# Altium footprint library CADTcommon.PcbLib: 503 footprints (part 27 of 32)
Each footprint in its own frame and in the unit in brackets; x right, y up, seen from the top. Pads: shape width x height; smd on the part's side, far side on the other; paste and mask are expansions set on the pad; w line width, h text height; cw(c..) or ccw(c..) is an arc to the next point about the centre after c.
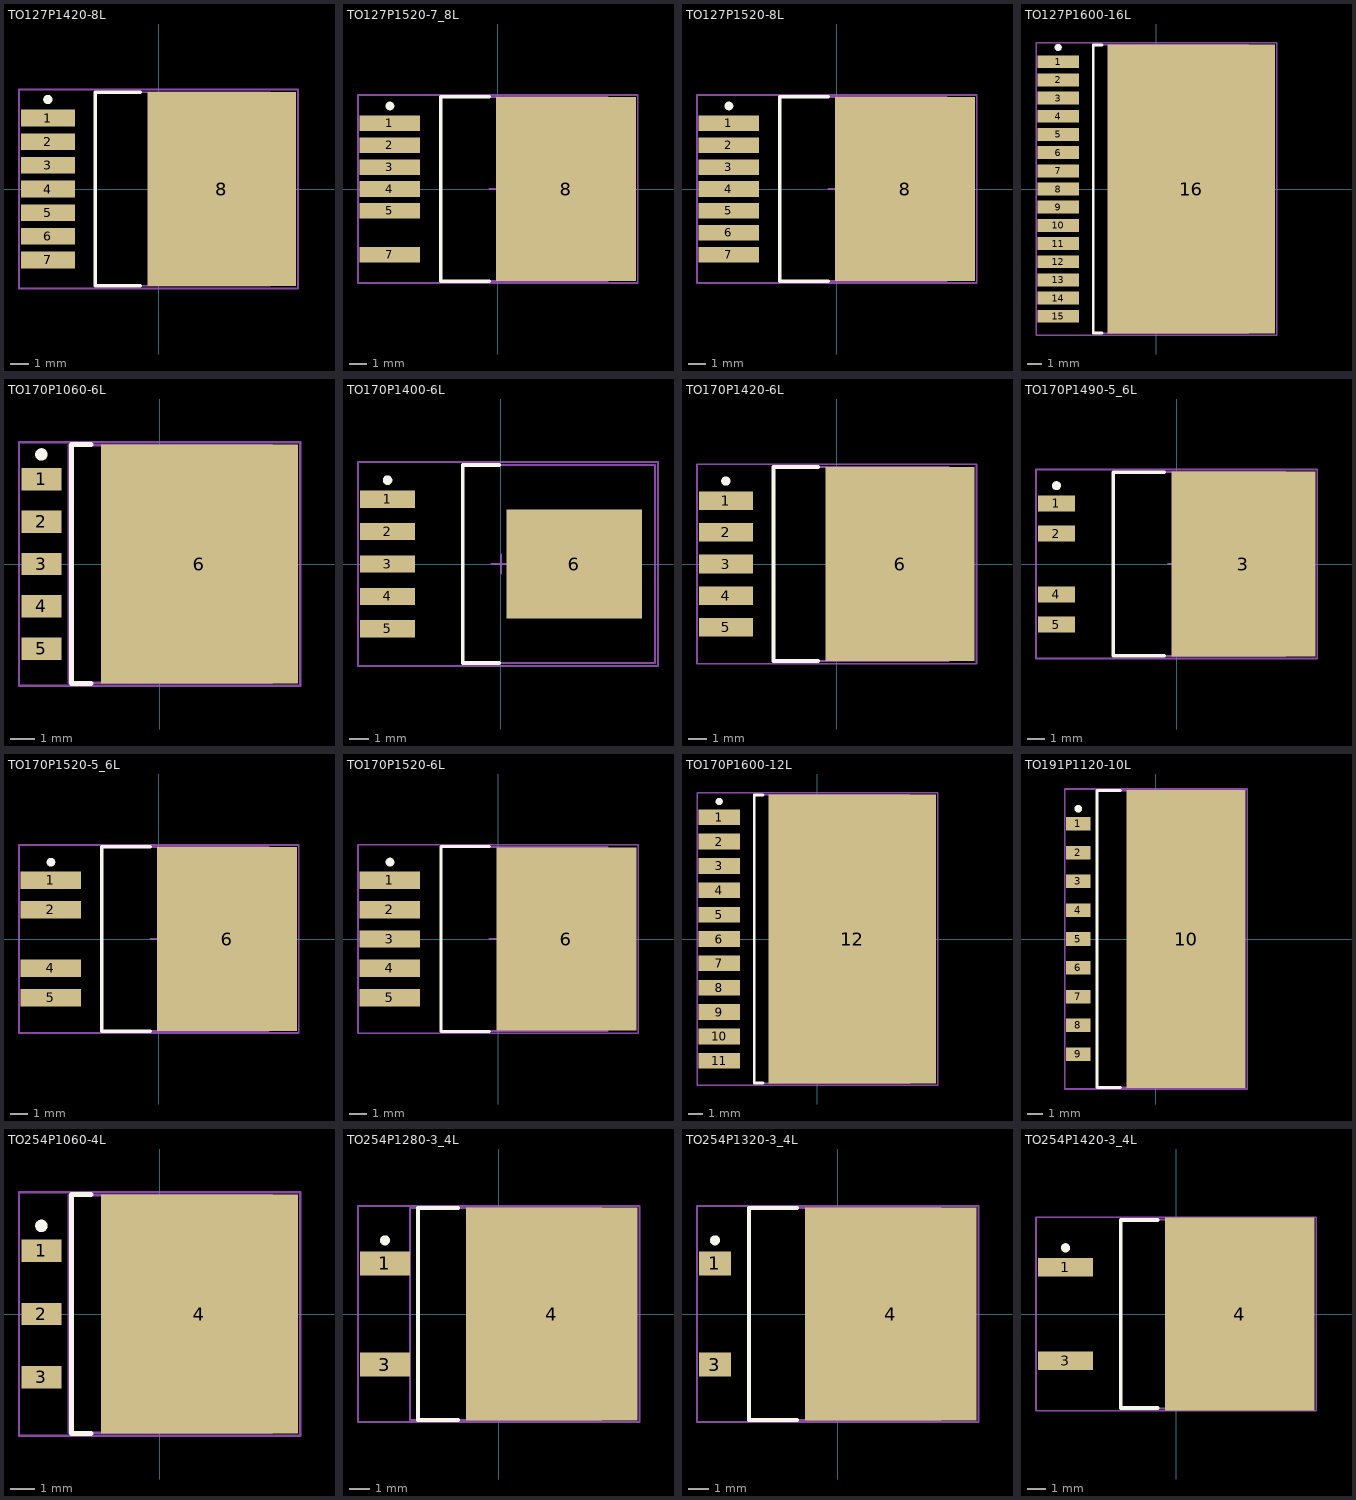
[diagram p26: the footprints below, top view; thin cyan lines are the x and y axes]

## TO127P1420-8L [mm] "D2-PAK, 8-Leads, Body 8.9x10.1mm, Pitch 1.27mm, Lead Span 14.2mm, IPC High Density"
height 4.65
pads (8):
  rect 2.9x0.9 smd: 1(-5.95,3.81) 2(-5.95,2.54) 3(-5.95,1.27) 4(-5.95,0) 5(-5.95,-1.27) 6(-5.95,-2.54) 7(-5.95,-3.81)
  rect 8x10.45 smd: 8(3.4,0)
Top Overlay:
  circle w0.25: c-5.95,4.81 r0.125
  lines w0.2: -1,-5.2 -3.4,-5.2 -3.4,5.2 -1,5.2
Mechanical 13:
  lines w0.1: -3.4,-5.2 6,-5.2 6,5.2 -3.4,5.2 -3.4,-5.2
Mechanical 15:
  lines w0.1: -0.5,0 0.5,0 ; 0,-0.5 0,0.5 ; -7.5,-5.35 7.5,-5.35 7.5,5.35 -7.5,5.35 -7.5,-5.35
3D body: height 4.65, standoff 0, extent -3.4,-5.2 6,5.2

## TO127P1520-7_8L [mm] "D2-PAK, 8-Leads, Body 9x10.2mm, Pitch 1.27mm, Lead Span 15.2mm, IPC High Density"
height 4.83
pads (7):
  rect 3.5x0.9 smd: 1(-6.25,3.81) 2(-6.25,2.54) 3(-6.25,1.27) 4(-6.25,0) 5(-6.25,-1.27) 7(-6.25,-3.81)
  rect 8.1x10.65 smd: 8(3.95,0)
Top Overlay:
  circle w0.25: c-6.25,4.81 r0.125
  lines w0.2: -0.5,-5.35 -3.3,-5.35 -3.3,5.35 -0.5,5.35
Mechanical 13:
  lines w0.1: -3.3,-5.325 -3.3,5.325 6.35,5.325 6.35,-5.325 -3.3,-5.325
Mechanical 15:
  lines w0.1: -0.5,0 0.5,0 ; 0,-0.5 0,0.5 ; -8.1,-5.45 -8.1,5.45 8.1,5.45 8.1,-5.45 -8.1,-5.45
3D body: height 4.83, standoff 0, extent -3.3,-5.325 6.35,5.325

## TO127P1520-8L [mm] "D2-PAK, 8-Leads, Body 9x10.2mm, Pitch 1.27mm, Lead Span 15.2mm, IPC High Density"
height 4.83
pads (8):
  rect 3.5x0.9 smd: 1(-6.25,3.81) 2(-6.25,2.54) 3(-6.25,1.27) 4(-6.25,0) 5(-6.25,-1.27) 6(-6.25,-2.54) 7(-6.25,-3.81)
  rect 8.1x10.65 smd: 8(3.95,0)
Top Overlay:
  circle w0.25: c-6.25,4.81 r0.125
  lines w0.2: -0.5,-5.35 -3.3,-5.35 -3.3,5.35 -0.5,5.35
Mechanical 13:
  lines w0.1: -3.3,-5.325 6.35,-5.325 6.35,5.325 -3.3,5.325 -3.3,-5.325
Mechanical 15:
  lines w0.1: -0.5,0 0.5,0 ; 0,-0.5 0,0.5 ; -8.1,-5.45 8.1,-5.45 8.1,5.45 -8.1,5.45 -8.1,-5.45
3D body: height 4.83, standoff 0, extent -3.3,-5.325 6.35,5.325

## TO127P1600-16L [mm] "TO, 16-Leads, Body 10.7x20mm, Pitch 1.27mm, Lead Span 16mm, IPC High Density"
height 4.65
pads (16):
  rect 2.9x0.9 smd: 1(-6.85,8.89) 2(-6.85,7.62) 3(-6.85,6.35) 4(-6.85,5.08) 5(-6.85,3.81) 6(-6.85,2.54) 7(-6.85,1.27) 8(-6.85,0) 9(-6.85,-1.27) 10(-6.85,-2.54) 11(-6.85,-3.81) 12(-6.85,-5.08) 13(-6.85,-6.35) 14(-6.85,-7.62) 15(-6.85,-8.89)
  rect 11.7x20.2 smd: 16(2.45,0)
Top Overlay:
  circle w0.25: c-6.85,9.89 r0.125
  lines w0.2: -3.8,-10.05 -4.4,-10.05 -4.4,10.05 -3.8,10.05
Mechanical 13:
  lines w0.1: -4.4,-10.075 6.42,-10.075 6.42,10.075 -4.4,10.075 -4.4,-10.075
Mechanical 15:
  lines w0.1: -0.5,0 0.5,0 ; 0,-0.5 0,0.5 ; -8.4,-10.2 8.4,-10.2 8.4,10.2 -8.4,10.2 -8.4,-10.2
3D body: height 4.65, standoff 0, extent -4.4,-10.075 6.42,10.075

## TO170P1060-6L [mm] "D-PAK, 6-Leads, Body 8x9.4mm, Pitch 1.7mm, Lead Span 10.6mm, IPC High Density"
height 2.05
pads (6):
  rect 1.6x0.9 smd: 1(-4.75,3.4) 2(-4.75,1.7) 3(-4.75,0) 4(-4.75,-1.7) 5(-4.75,-3.4)
  rect 7.9x9.6 smd: 6(1.6,0)
Top Overlay:
  circle w0.25: c-4.75,4.4 r0.125
  lines w0.2: -2.75,-4.8 -3.55,-4.8 -3.55,4.8 -2.75,4.8
Mechanical 13:
  lines w0.1: -3.65,-4.775 -3.65,4.775 4.5,4.775 4.5,-4.775 -3.65,-4.775
Mechanical 15:
  lines w0.1: -0.5,0 0.5,0 ; 0,-0.5 0,0.5 ; -5.65,-4.9 -5.65,4.9 5.65,4.9 5.65,-4.9 -5.65,-4.9
3D body: height 2.05, standoff 0, extent -3.65,-4.775 4.5,4.775

## TO170P1400-6L [mm] "D2-PAK, 6-Leads, Body 9.9x10.2mm, Pitch 1.7mm, Lead Span 14mm, IPC High Density"
height 2.1
pads (6):
  rect 2.9x0.9 smd: 1(-5.95,3.4) 2(-5.95,1.7) 3(-5.95,0) 4(-5.95,-1.7) 5(-5.95,-3.4)
  rect 7.1x5.7 smd: 6(3.85,0)
Top Overlay:
  circle w0.25: c-5.95,4.4 r0.125
  lines w0.2: -0.1,-5.2 -2,-5.2 -2,5.2 -0.1,5.2
Mechanical 13:
  lines w0.1: -2,-5.2 -2,5.2 8.1,5.2 8.1,-5.2 -2,-5.2
Mechanical 15:
  lines w0.1: -0.5,0 0.5,0 ; 0,-0.5 0,0.5 ; -7.5,-5.35 -7.5,5.35 8.25,5.35 8.25,-5.35 -7.5,-5.35
3D body: height 2.1, standoff 0, extent -1.999,-5.199 8.099,5.199

## TO170P1420-6L [mm] "D2-PAK, 6-Leads, Body 8.9x10.1mm, Pitch 1.7mm, Lead Span 14.2mm, IPC High Density"
height 4.65
pads (6):
  rect 2.9x1 smd: 1(-5.95,3.4) 2(-5.95,1.7) 3(-5.95,0) 4(-5.95,-1.7) 5(-5.95,-3.4)
  rect 8x10.4 smd: 6(3.4,0)
Top Overlay:
  circle w0.25: c-5.95,4.45 r0.125
  lines w0.2: -1,-5.2 -3.4,-5.2 -3.4,5.2 -1,5.2
Mechanical 13:
  lines w0.1: -3.4,-5.2 6,-5.2 6,5.2 -3.4,5.2 -3.4,-5.2
Mechanical 15:
  lines w0.1: -0.5,0 0.5,0 ; 0,-0.5 0,0.5 ; -7.5,-5.35 7.5,-5.35 7.5,5.35 -7.5,5.35 -7.5,-5.35
3D body: height 4.65, standoff 0, extent -3.4,-5.2 6,5.2

## TO170P1490-5_6L [mm] "D2-PAK, 6-Leads, Body 9.1x10.3mm, Pitch 1.7mm, Lead Span 14.9mm, IPC High Density"
height 4.55
pads (5):
  rect 2.1x0.9 smd: 1(-6.75,3.4) 2(-6.75,1.7) 4(-6.75,-1.7) 5(-6.75,-3.4)
  rect 8.1x10.4 smd: 3(3.75,0)
Top Overlay:
  circle w0.25: c-6.75,4.4 r0.125
  lines w0.2: -0.7,-5.15 -3.55,-5.15 -3.55,5.15 -0.7,5.15
Mechanical 13:
  lines w0.1: -3.55,-5.175 -3.55,5.175 6.1,5.175 6.1,-5.175 -3.55,-5.175
Mechanical 15:
  lines w0.1: -0.5,0 0.5,0 ; 0,-0.5 0,0.5 ; -7.9,-5.3 -7.9,5.3 7.9,5.3 7.9,-5.3 -7.9,-5.3
3D body: height 4.55, standoff 0, extent -3.55,-5.175 6.1,5.175

## TO170P1520-5_6L [mm] "D2-PAK, 6-Leads, Body 9x10.2mm, Pitch 1.7mm, Lead Span 15.2mm, IPC High Density"
height 4.83
pads (5):
  rect 3.5x1 smd: 1(-6.25,3.4) 2(-6.25,1.7) 4(-6.25,-1.7) 5(-6.25,-3.4)
  rect 8.1x10.65 smd: 6(3.95,0)
Top Overlay:
  circle w0.25: c-6.25,4.45 r0.125
  lines w0.2: -0.5,-5.35 -3.3,-5.35 -3.3,5.35 -0.5,5.35
Mechanical 13:
  lines w0.1: -3.3,-5.325 6.35,-5.325 6.35,5.325 -3.3,5.325 -3.3,-5.325
Mechanical 15:
  lines w0.1: -0.5,0 0.5,0 ; 0,-0.5 0,0.5 ; -8.1,-5.45 8.1,-5.45 8.1,5.45 -8.1,5.45 -8.1,-5.45
3D body: height 4.83, standoff 0, extent -3.3,-5.325 6.35,5.325

## TO170P1520-6L [mm] "D2-PAK, 6-Leads, Body 9x10.2mm, Pitch 1.7mm, Lead Span 15.2mm, IPC High Density"
height 4.83
pads (6):
  rect 3.5x1 smd: 1(-6.25,3.4) 2(-6.25,1.7) 3(-6.25,0) 4(-6.25,-1.7) 5(-6.25,-3.4)
  rect 8.1x10.6 smd: 6(3.95,0)
Top Overlay:
  circle w0.25: c-6.25,4.45 r0.125
  lines w0.2: -0.5,-5.35 -3.3,-5.35 -3.3,5.35 -0.5,5.35
Mechanical 13:
  lines w0.1: -3.3,-5.325 6.35,-5.325 6.35,5.325 -3.3,5.325 -3.3,-5.325
Mechanical 15:
  lines w0.1: -0.5,0 0.5,0 ; 0,-0.5 0,0.5 ; -8.1,-5.45 8.1,-5.45 8.1,5.45 -8.1,5.45 -8.1,-5.45
3D body: height 4.83, standoff 0, extent -3.3,-5.325 6.35,5.325

## TO170P1600-12L [mm] "TO, 12-Leads, Body 10.7x20mm, Pitch 1.7mm, Lead Span 16mm, IPC High Density"
height 4.65
pads (12):
  rect 2.9x1.1 smd: 1(-6.85,8.5) 2(-6.85,6.8) 3(-6.85,5.1) 4(-6.85,3.4) 5(-6.85,1.7) 6(-6.85,0) 7(-6.85,-1.7) 8(-6.85,-3.4) 9(-6.85,-5.1) 10(-6.85,-6.8) 11(-6.85,-8.5)
  rect 11.7x20.2 smd: 12(2.45,0)
Top Overlay:
  circle w0.25: c-6.85,9.6 r0.125
  lines w0.2: -3.8,-10.05 -4.4,-10.05 -4.4,10.05 -3.8,10.05
Mechanical 13:
  lines w0.1: -4.4,-10.075 6.42,-10.075 6.42,10.075 -4.4,10.075 -4.4,-10.075
Mechanical 15:
  lines w0.1: -0.5,0 0.5,0 ; 0,-0.5 0,0.5 ; -8.4,-10.2 8.4,-10.2 8.4,10.2 -8.4,10.2 -8.4,-10.2
3D body: height 4.65, standoff 0, extent -4.4,-10.075 6.42,10.075

## TO191P1120-10L [mm] "TO, 10-Leads, Body 8.7x19.6mm, Pitch 1.91mm, Lead Span 11.2mm, IPC High Density"
height 2.05
pads (10):
  rect 1.6x0.9 smd: 1(-5.15,7.64) 2(-5.15,5.73) 3(-5.15,3.82) 4(-5.15,1.91) 5(-5.15,0) 6(-5.15,-1.91) 7(-5.15,-3.82) 8(-5.15,-5.73) 9(-5.15,-7.64)
  rect 7.9x19.75 smd: 10(2,0)
Top Overlay:
  circle w0.25: c-5.15,8.64 r0.125
  lines w0.2: -2.35,-9.85 -3.9,-9.85 -3.9,9.85 -2.35,9.85
Mechanical 13:
  lines w0.1: -3.9,-9.85 4.9,-9.85 4.9,9.85 -3.9,9.85 -3.9,-9.85
Mechanical 15:
  lines w0.1: -0.5,0 0.5,0 ; 0,-0.5 0,0.5 ; -6.05,-9.95 6.05,-9.95 6.05,9.95 -6.05,9.95 -6.05,-9.95
3D body: height 2.05, standoff 0, extent -3.9,-9.85 4.9,9.85

## TO254P1060-4L [mm] "D-PAK, 4-Leads, Body 8x9.4mm, Pitch 2.54mm, Lead Span 10.6mm, IPC High Density"
height 2.05
pads (4):
  rect 1.6x0.9 smd: 1(-4.75,2.54) 2(-4.75,0) 3(-4.75,-2.54)
  rect 7.9x9.6 smd: 4(1.6,0)
Top Overlay:
  circle w0.25: c-4.75,3.54 r0.125
  lines w0.2: -2.75,-4.8 -3.55,-4.8 -3.55,4.8 -2.75,4.8
Mechanical 13:
  lines w0.1: -3.65,-4.775 4.5,-4.775 4.5,4.775 -3.65,4.775 -3.65,-4.775
Mechanical 15:
  lines w0.1: -0.5,0 0.5,0 ; 0,-0.5 0,0.5 ; -5.65,-4.9 5.65,-4.9 5.65,4.9 -5.65,4.9 -5.65,-4.9
3D body: height 2.05, standoff 0, extent -3.65,-4.775 4.5,4.775

## TO254P1280-3_4L [mm] "TO, 4-Leads, Body 9.6x10.2mm, Pitch 2.54mm, Lead Span 12.8mm, IPC High Density"
height 5.1
pads (3):
  rect 2.5x1.2 smd: 1(-5.7,2.54) 3(-5.7,-2.54)
  rect 8.6x10.65 smd: 4(2.65,0)
Top Overlay:
  circle w0.25: c-5.7,3.69 r0.125
  lines w0.2: -2.05,-5.3 -4.05,-5.3 -4.05,5.3 -2.05,5.3
Mechanical 13:
  lines w0.1: -4.45,-5.3 -4.45,5.3 5.15,5.3 5.15,-5.3 -4.45,-5.3
Mechanical 15:
  lines w0.1: -0.5,0 0.5,0 ; 0,-0.5 0,0.5 ; -7.05,-5.4 -7.05,5.4 7.05,5.4 7.05,-5.4 -7.05,-5.4
3D body: height 5.1, standoff 0, extent -4.45,-5.3 5.15,5.3

## TO254P1320-3_4L [mm] "TO, 4-Leads, Body 9.6x10.2mm, Pitch 2.54mm, Lead Span 13.2mm, IPC High Density"
height 5.1
pads (3):
  rect 1.6x1.2 smd: 1(-6.15,2.54) 3(-6.15,-2.54)
  rect 8.6x10.65 smd: 4(2.65,0)
Top Overlay:
  circle w0.25: c-6.15,3.69 r0.125
  lines w0.2: -2.05,-5.3 -4.45,-5.3 -4.45,5.3 -2.05,5.3
Mechanical 13:
  lines w0.1: -4.45,-5.3 -4.45,5.3 5.15,5.3 5.15,-5.3 -4.45,-5.3
Mechanical 15:
  lines w0.1: -0.5,0 0.5,0 ; 0,-0.5 0,0.5 ; -7.05,-5.4 -7.05,5.4 7.05,5.4 7.05,-5.4 -7.05,-5.4
3D body: height 5.1, standoff 0, extent -4.45,-5.3 5.15,5.3

## TO254P1420-3_4L [mm] "D2-PAK, 4-Leads, Body 9.2x10mm, Pitch 2.54mm, Lead Span 14.2mm, IPC High Density"
height 4.57
pads (3):
  rect 3x1 smd: 1(-6,2.54) 3(-6,-2.54)
  rect 8.1x10.45 smd: 4(3.45,0)
Top Overlay:
  circle w0.25: c-6,3.59 r0.125
  lines w0.2: -1,-5.1 -3,-5.1 -3,5.1 -1,5.1
Mechanical 13:
  lines w0.1: -3,-5.125 -3,5.125 6.35,5.125 6.35,-5.125 -3,-5.125
Mechanical 15:
  lines w0.1: -0.5,0 0.5,0 ; 0,-0.5 0,0.5 ; -7.6,-5.25 -7.6,5.25 7.6,5.25 7.6,-5.25 -7.6,-5.25
3D body: height 4.57, standoff 0, extent -3,-5.125 6.35,5.125